# Altium footprint library std-th.PcbLib: 245 footprints (part 14 of 16)
Each footprint in its own frame and in the unit in brackets; x right, y up, seen from the top. Pads: shape width x height; smd on the part's side, far side on the other; paste and mask are expansions set on the pad; w line width, h text height; cw(c..) or ccw(c..) is an arc to the next point about the centre after c.
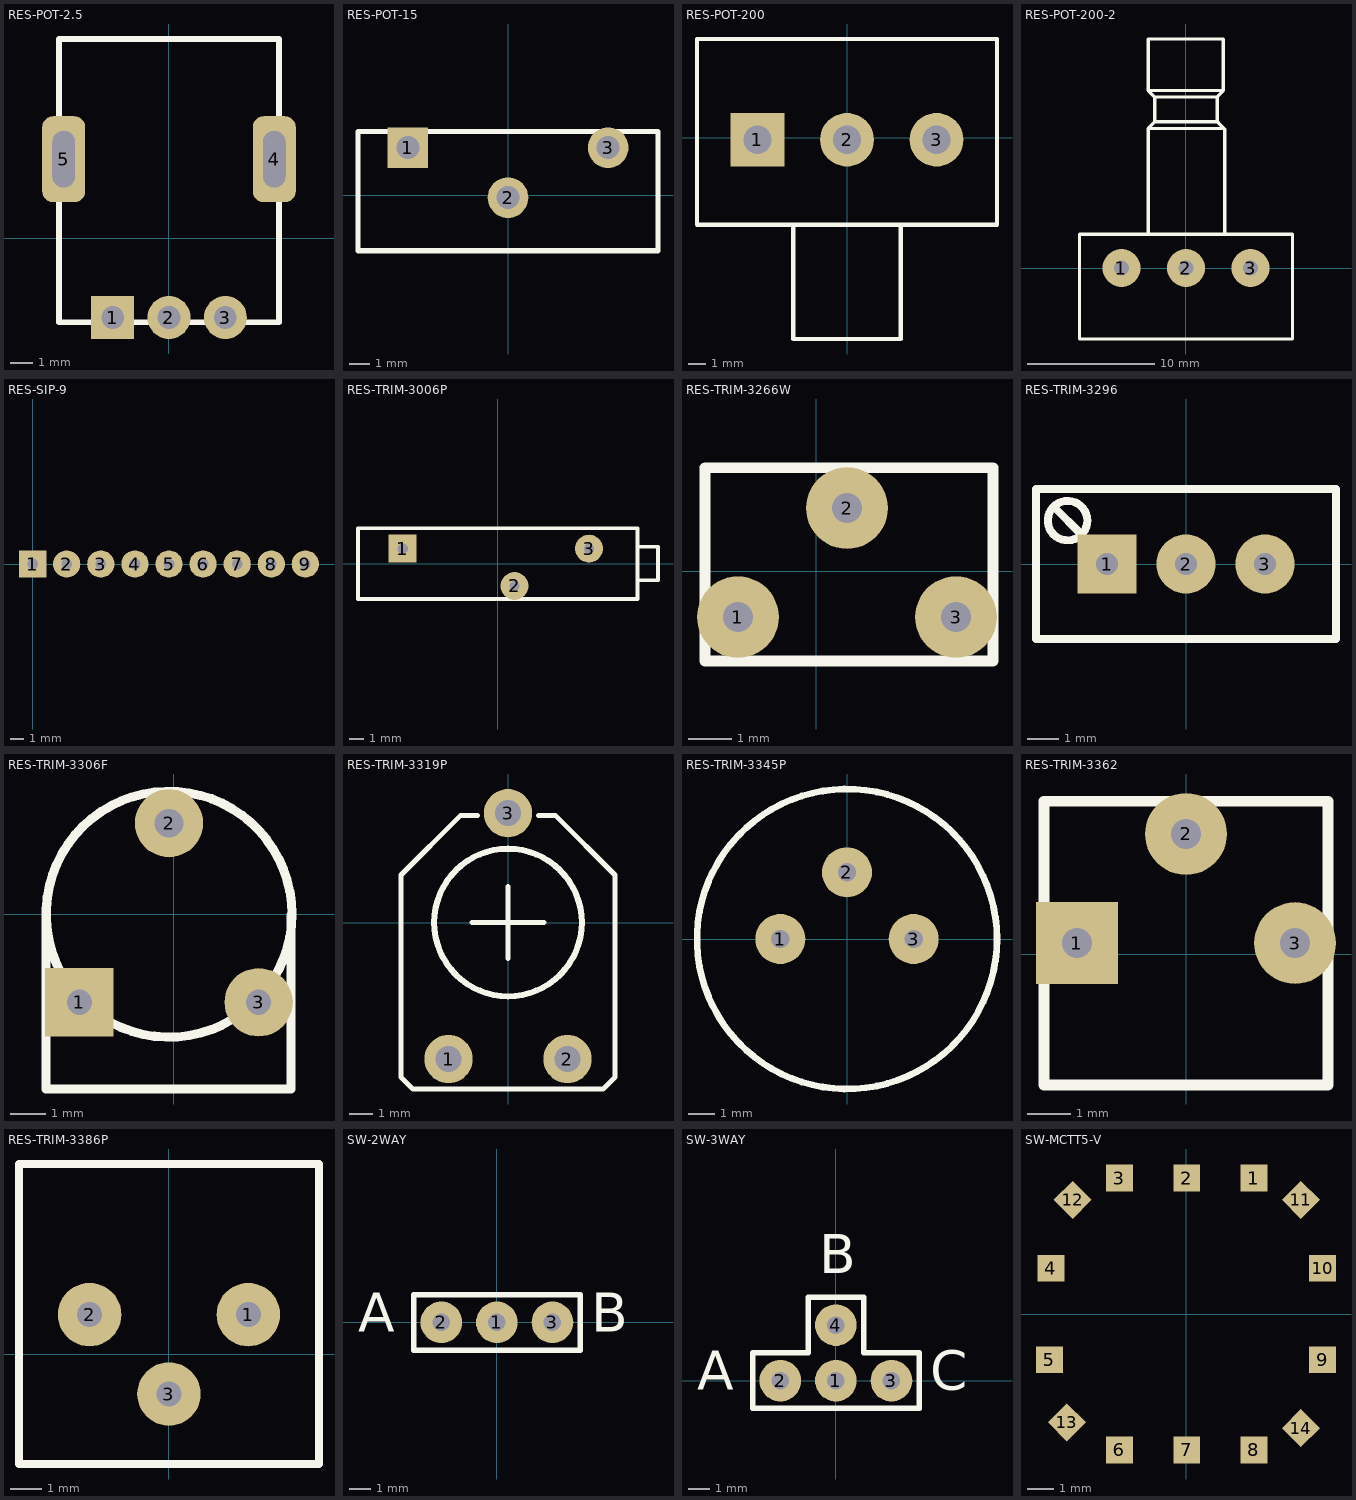
[diagram p13: the footprints below, top view; thin cyan lines are the x and y axes]

## RES-POT-2.5 [mm] "Potentiometer, 3 leads, 2.5 mm pitch, vertical"
height 20
pads (5):
  rect 1.905x1.905 hole 1: 1(-2.5,-3.508)
  round 1.905 hole 1: 2(0,-3.508) 3(2.5,-3.508)
  rrect50% 1.905x3.81 hole 1 slot 2.5 at 90 deg: 4(4.666,3.508) 5(-4.666,3.507)
Top Overlay:
  lines w0.254: -4.876,-3.717 -4.876,8.833 4.876,8.833 4.876,-3.717 -4.876,-3.717
3D body: height 20, standoff -3.8, extent -4.876,-3.717 4.876,8.833

## RES-POT-15 [mil] "Variable Resistor, Thru-Hole; 3 Leads, 15mm"
height 400
pads (3):
  rect 80x80 hole 45: 1(-196.85,93.42)
  round 80 hole 45: 2(0,-5) 3(196.85,93.42)
Top Overlay:
  lines w10: -295,-109.32 -295,125 295,125 295,-109.32 -295,-109.32
3D body: height 688.98, standoff -157.48, extent -295.27,-109.32 295.29,126.9

## RES-POT-200 [mil] "Variable Resistor, Thru-Hole; 3 Leads, 200 mil pitch, right angle"
height 1000
pads (3):
  rect 120x120 hole 62.99: 1(-200,-5)
  round 120 hole 62.99: 2(0,-5) 3(200,-5)
Top Overlay:
  lines w10: -120,-195 -120,-450 120,-450 120,-195 ; -335,-195 335,-195 335,220 -335,220 -335,-195
3D body: height 838.58, standoff -153.54, extent -333.95,-730.39 333.95,222.36

## RES-POT-200-2 [mm] "Potentiometer, 200 mil pitch"
height 18
pads (3):
  round 3 hole 1.2: 1(-5.08,0) 2(0,0) 3(5.08,0)
Top Overlay:
  lines w0.254: -2.976,2.667 -2.978,2.669 -2.978,10.992 ; 2.496,11.513 -2.457,11.513 ; 2.921,13.956 2.906,13.972 -2.978,13.972 ; 2.991,10.992 -2.978,10.992 ; 3.048,2.669 3.048,10.936 2.46,11.524 2.46,13.462 ; -8.382,-5.588 -8.382,2.667 8.382,2.667 8.382,-5.588 -8.382,-5.588 ; -8.382,-5.588 -8.382,-5.588 ; -2.978,10.992 -2.921,11.049 -2.457,11.513 ; -2.978,13.972 -2.976,13.97 -2.965,13.97 -2.457,13.462 ; -2.978,13.972 -2.978,18.034 2.935,18.034 2.935,13.97 2.46,13.495 2.46,13.462 ; -2.457,11.513 -2.457,11.557 -2.457,13.462 ; -2.457,13.462 2.46,13.462
3D body: height 21.08, standoff -3.86, extent -8.382,-5.588 8.382,18.542

## RES-SIP-9 [mil] "Resistor, network, 8 way common"
height 236.22
pads (9):
  rect 80x80 hole 31.5: 1(0,0)
  round 80 hole 31.5: 2(100,0) 3(200,0) 4(300,0) 5(400,0) 6(500,0) 7(600,0) 8(700,0) 9(800,0)
3D body: height 201.23, standoff -133.42, extent -41.33,-24.6 844.5,24.61

## RES-TRIM-3006P [mil] "Variable Resistor, Thru-Hole; 3 Leads, 800 mil, rectangular"
height 250
pads (3):
  rect 75x75 hole 27.56: 1(-255,40)
  round 75 hole 27.56: 2(45,-60) 3(245,40)
Top Overlay:
  lines w10: 375,-45 430,-45 430,45 375,45 ; -374.99,-94.99 375,-95 375,95 -375,95 -375,-94.99
3D body: height 250, standoff -205, extent -374.99,-94.99 435,95.01

## RES-TRIM-3266W [mm] "Trimpot, Bourns 3266W, 3 leads, 100 mil pitch"
pads (3):
  round 1.905 hole 0.7: 1(-1.829,-1.067) 2(0.711,1.473) 3(3.251,-1.067)
Top Overlay:
  lines w0.254: -2.591,-2.083 -2.591,2.413 4.115,2.413 4.115,-2.083 -2.591,-2.083
3D body: height 8.25, standoff -1.91, extent -2.591,-2.083 4.115,2.413

## RES-TRIM-3296 [mm] "Variable Resistor, Thru-Hole; 3 Leads, 90 mil, vertical"
height 11.684
pads (3):
  rect 1.905x1.905 hole 0.7: 1(-2.54,0)
  round 1.905 hole 0.7: 2(0,0) 3(2.54,0)
Top Overlay:
  circle w0.254: c-3.81,1.397 r0.635
  lines w0.254: -4.191,1.778 -3.429,1.016 ; -4.826,-2.413 4.826,-2.413 4.826,2.413 -4.445,2.413 -4.826,2.413 -4.826,-2.413
3D body: height 11.55, standoff -6.4, extent -4.765,-2.41 4.765,2.421

## RES-TRIM-3306F [mm] "Variable Resistor, Thru-Hole; 3 Leads, 100 mil, triangle centered"
height 5.08
pads (3):
  rect 1.905x1.905 hole 0.7: 1(-2.627,-2.458)
  round 1.905 hole 0.8: 2(-0.127,2.54)
  round 1.905 hole 0.7: 3(2.373,-2.458)
Top Overlay:
  circle w0.254: c-0.127,0 r3.429
  lines w0.254: -3.556,-4.876 -3.556,0 ; -3.532,-4.876 3.278,-4.876 3.278,-0.024 3.302,0
3D body: height 7.62, standoff -3.04, extent -3.532,-4.876 3.278,3.375

## RES-TRIM-3319P [mil] "Trimmer, Bours 3319P Series, 3 leads, 5 mm pitch"
height 236.22
pads (3):
  round 80 hole 43.31: 1(-98.43,-225.98) 2(98.42,-225.98) 3(-0.01,181.1)
Top Overlay:
  circle w10: c-0.01,0 r122.15
  lines w8: -60,0 60,0 ; -50,177.16 -78.75,177.16 -177.17,78.74 -177.17,-255.91 -157.49,-275.59 157.48,-275.59 177.16,-255.91 177.16,78.74 78.73,177.16 50,177.16 ; 0,-60 0,60
3D body: height 249.51, standoff -157.97, extent -177.16,-275.58 177.17,192.99

## RES-TRIM-3345P [mm] "Variable Resistor, Thru-Hole; 3 Leads, 260 mil, circular"
height 4.826
pads (3):
  round 1.905 hole 0.7: 1(-2.54,0) 2(0,2.54) 3(2.54,0)
Top Overlay:
  circle w0.254: c0,0 r5.715
3D body: height 7.26, standoff -5.08, extent -5.715,-5.715 5.715,5.715

## RES-TRIM-3362 [mm] "Variable Resistor, Thru-Hole; 3 Leads, 90 mil, triangle"
height 5.08
pads (3):
  rect 1.905x1.905 hole 0.7: 1(-2.54,0.254)
  round 1.905 hole 0.7: 2(0,2.794) 3(2.54,0.254)
Top Overlay:
  lines w0.254: -3.302,-3.048 -2.286,-3.048 3.302,-3.048 3.302,3.556 2.413,3.556 -3.302,3.556 -3.302,-3.048
3D body: height 4.72, standoff -2.67, extent -3.3,-3.046 3.3,3.554

## RES-TRIM-3386P [mil] "Trimpot, 200 mil x 100 mil pitch"
height 314.96
pads (3):
  round 80 hole 31.5: 1(100,50) 2(-100,50) 3(0.04,-50)
Top Overlay:
  lines w10: -188.92,-138.18 189.03,-138.18 189.03,239.77 -188.92,239.77 -188.92,-138.18
3D body: height 197.74, standoff -216.04, extent -188.92,-138.18 189.03,239.77

## SW-2WAY [mm] "2 way jumper"
height 8
pads (3):
  round 1.905 hole 0.8: 1(0,0) 2(-2.54,0) 3(2.54,0)
Top Overlay:
  lines w0.254: -3.81,1.27 -3.81,-1.27 3.81,-1.27 ; -3.81,1.27 -3.81,1.27 ; -3.81,1.27 3.81,1.27 3.81,-1.27 ; 3.81,-1.27 3.81,-1.27
  text "B" at 4.318,-1.016 h3.05
  text "A" at -6.35,-1.016 h3.05
3D body: height 8.44, standoff -2.54, extent -1.27,-1.27 3.81,1.27
3D body: height 8.44, standoff -2.54, extent -3.81,-1.27 1.27,1.27

## SW-3WAY [mm] "3 way jumper"
height 8
pads (4):
  round 1.905 hole 0.8: 1(0,0) 2(-2.54,0) 3(2.54,0) 4(0,2.54)
Top Overlay:
  lines w0.254: -3.81,1.27 -3.81,-1.27 3.81,-1.27 ; -3.81,1.27 -3.81,1.27 ; -3.81,1.27 -1.27,1.27 ; -1.27,1.27 -1.27,1.27 ; -1.27,1.27 -1.27,3.81 1.27,3.81 ; 1.27,3.81 1.27,3.81 ; 1.27,3.81 1.27,1.27 3.81,1.27 3.81,-1.27 ; 3.81,-1.27 3.81,-1.27
  text "C" at 4.318,-1.016 h3.05
  text "B" at -0.762,4.318 h3.05
  text "A" at -6.35,-1.016 h3.05
3D body: height 8.44, standoff -2.54, extent -1.27,-1.27 1.27,3.81
3D body: height 8.44, standoff -2.54, extent -1.27,-1.27 3.81,1.27
3D body: height 8.44, standoff -2.54, extent -3.81,-1.27 1.27,1.27

## SW-MCTT5-V [mm] "Switch, tacticle, joystick"
height 1.55
pads (14):
  rect 1x1 smd paste+0 mask+0: 1(2.527,5.05) 2(0.026,5.05) 3(-2.474,5.05) 4(-5.023,1.7) 5(-5.076,-1.7) 6(-2.474,-5.05) 7(0.026,-5.05) 8(2.527,-5.05) 9(5.076,-1.7) 10(5.076,1.7)
  rect 1x1 smd rot 45 paste+0 mask+0: 11(4.269,4.243) 12(-4.216,4.243) 13(-4.428,-4.031) 14(4.269,-4.243)
3D body: height 1.55, standoff 0, extent -5.173,-5.2 5.227,5.2